# Altium schematic symbol library Analog Devices Operational Amplifiers.SchLib: 2102 symbols (part 19 of 35) (continued)
## AD8628WARZ-R7
designator U?
Single Channel RRIO Operational Amplifier, 2.5 MHz BW, 1 V/us SR, Automotive, 8-pin SOIC (R-8), Reel; Generic Part Number: AD8628; Manufacturer: Analog Devices; PartNumber: AD8628WARZ-R7; Amplifiers Per Package: 1; Automotive Qualified: Yes; Input Bias Current: 30pA; Input Offset Voltage: 1uV; Iq/Amp: 1.1mA; Slew Rate: 1V/us; Small Signal Bandwidth: 2.5MHz; V Span Max: 6V; V Span Min: 2.7V; DatasheetVersion: Rev. I; PackageVersion: 060506-A; PackageReference: R-8; PackageDescription: 8-Pin Standard Small Outline Package, Body 3.9 x 4.9 mm, Pitch 1.27 mm; Supplier 1: Digi-Key; Supplier Part Number 1: AD8628WARZ-R7TR-ND; Supplier 2: Digi-Key; Supplier Part Number 2: AD8628WARZ-R7CT-ND; Supplier 3: Digi-Key; Supplier Part Number 3: AD8628WARZ-R7DKR-ND; Mounting Technology: Surface Mount; Code_JEDEC: MS-012-AA; ComponentLink1Description: Manufacturer URL; ComponentLink1URL: http://www.analog.com/en/index.html; ComponentLink2Description: Datasheet; ComponentLink2URL: http://www.analog.com/static/imported-files/data_sheets/AD8628_8629_8630.pdf; ComponentLink3Description: Package Specification; ComponentLink3URL: http://www.analog.com/static/imported-files/packages/PKG_PDF/SOIC_Narrow%20(R)/R_8.pdf; ComponentLink4Description: Reference Circuit; ComponentLink4URL: http://www.analog.com/en/all-operational-amplifiers-op-amps/operational-amplifiers-op-amps/ad8628/products/product.html#product-recommendations
footprint ADI-R-8_N (SOIC, 8-Leads, Body 4.9x3.9mm, Pitch 1.27mm, IPC Medium Density)
footprint ADI-R-8_L (SOIC, 8-Leads, Body 4.9x3.9mm, Pitch 1.27mm, IPC High Density)
footprint ADI-R-8_M (SOIC, 8-Leads, Body 4.9x3.9mm, Pitch 1.27mm, IPC Low Density)
part A pins: 2 -IN (in), 3 +IN (in), 4 -V (power), 6 OUT (out), 7 +V (power)
part B pins: 1 NC, 5 NC, 8 NC

## AD8628WARZ-RL
designator U?
Single Channel RRIO Operational Amplifier, 2.5 MHz BW, 1 V/us SR, Automotive, 8-pin SOIC (R-8), Reel; Generic Part Number: AD8628; Manufacturer: Analog Devices; PartNumber: AD8628WARZ-RL; Amplifiers Per Package: 1; Automotive Qualified: Yes; Input Bias Current: 30pA; Input Offset Voltage: 1uV; Iq/Amp: 1.1mA; Slew Rate: 1V/us; Small Signal Bandwidth: 2.5MHz; V Span Max: 6V; V Span Min: 2.7V; DatasheetVersion: Rev. I; PackageVersion: 060506-A; PackageReference: R-8; PackageDescription: 8-Pin Standard Small Outline Package, Body 3.9 x 4.9 mm, Pitch 1.27 mm; Supplier 1: Digi-Key; Supplier Part Number 1: AD8628WARZ-RL-ND; Mounting Technology: Surface Mount; Code_JEDEC: MS-012-AA; ComponentLink1Description: Manufacturer URL; ComponentLink1URL: http://www.analog.com/en/index.html; ComponentLink2Description: Datasheet; ComponentLink2URL: http://www.analog.com/static/imported-files/data_sheets/AD8628_8629_8630.pdf; ComponentLink3Description: Package Specification; ComponentLink3URL: http://www.analog.com/static/imported-files/packages/PKG_PDF/SOIC_Narrow%20(R)/R_8.pdf; ComponentLink4Description: Reference Circuit; ComponentLink4URL: http://www.analog.com/en/all-operational-amplifiers-op-amps/operational-amplifiers-op-amps/ad8628/products/product.html#product-recommendations
footprint ADI-R-8_N (SOIC, 8-Leads, Body 4.9x3.9mm, Pitch 1.27mm, IPC Medium Density)
footprint ADI-R-8_L (SOIC, 8-Leads, Body 4.9x3.9mm, Pitch 1.27mm, IPC High Density)
footprint ADI-R-8_M (SOIC, 8-Leads, Body 4.9x3.9mm, Pitch 1.27mm, IPC Low Density)
part A pins: 2 -IN (in), 3 +IN (in), 4 -V (power), 6 OUT (out), 7 +V (power)
part B pins: 1 NC, 5 NC, 8 NC

## AD8628WAUJZ-R7
designator U?
Single Channel RRIO Operational Amplifier, 2.5 MHz BW, 1 V/us SR, Automotive, 5-pin SOT23 (UJ-5), Reel; Generic Part Number: AD8628; Manufacturer: Analog Devices; PartNumber: AD8628WAUJZ-R7; Amplifiers Per Package: 1; Automotive Qualified: Yes; Input Bias Current: 30pA; Input Offset Voltage: 1uV; Iq/Amp: 1.1mA; Slew Rate: 1V/us; Small Signal Bandwidth: 2.5MHz; V Span Max: 6V; V Span Min: 2.7V; DatasheetVersion: Rev. I; PackageVersion: 100708-A; PackageReference: UJ-5; PackageDescription: 5-Pin Thin Small Outline Transistor Package, Body 2.9 x 1.6 mm, Pitch 0.95 mm; Supplier 1: Digi-Key; Supplier Part Number 1: AD8628WAUJZ-R7TR-ND; Supplier 2: Digi-Key; Supplier Part Number 2: AD8628WAUJZ-R7CT-ND; Supplier 3: Digi-Key; Supplier Part Number 3: AD8628WAUJZ-R7DKR-ND; Mounting Technology: Surface Mount; Code_JEDEC: MO-193-AB; ComponentLink1Description: Manufacturer URL; ComponentLink1URL: http://www.analog.com/en/index.html; ComponentLink2Description: Datasheet; ComponentLink2URL: http://www.analog.com/static/imported-files/data_sheets/AD8628_8629_8630.pdf; ComponentLink3Description: Package Specification; ComponentLink3URL: http:/www.analog.com/static/imported-files/packages/PKG_PDF/TSOT(UJ)/UJ_5.pdf; ComponentLink4Description: Reference Circuit; ComponentLink4URL: http://www.analog.com/en/all-operational-amplifiers-op-amps/operational-amplifiers-op-amps/ad8628/products/product.html#product-recommendations
footprint ADI-UJ-5_N (SOT23, 5-Leads, Body 2.9x1.6mm, Pitch 0.95mm, IPC Medium Density)
footprint ADI-UJ-5_L (SOT23, 5-Leads, Body 2.9x1.6mm, Pitch 0.95mm, IPC High Density)
footprint ADI-UJ-5_M (SOT23, 5-Leads, Body 2.9x1.6mm, Pitch 0.95mm, IPC Low Density)
pins: 1 OUT (out), 2 -V (power), 3 +IN (in), 4 -IN (in), 5 +V (power)

## AD8628WAUJZ-RL
designator U?
Single Channel RRIO Operational Amplifier, 2.5 MHz BW, 1 V/us SR, Automotive, 5-pin SOT23 (UJ-5), Reel; Generic Part Number: AD8628; Manufacturer: Analog Devices; PartNumber: AD8628WAUJZ-RL; Amplifiers Per Package: 1; Automotive Qualified: Yes; Input Bias Current: 30pA; Input Offset Voltage: 1uV; Iq/Amp: 1.1mA; Slew Rate: 1V/us; Small Signal Bandwidth: 2.5MHz; V Span Max: 6V; V Span Min: 2.7V; DatasheetVersion: Rev. I; PackageVersion: 100708-A; PackageReference: UJ-5; PackageDescription: 5-Pin Thin Small Outline Transistor Package, Body 2.9 x 1.6 mm, Pitch 0.95 mm; Supplier 1: Digi-Key; Supplier Part Number 1: AD8628WAUJZ-RL-ND; Mounting Technology: Surface Mount; Code_JEDEC: MO-193-AB; ComponentLink1Description: Manufacturer URL; ComponentLink1URL: http://www.analog.com/en/index.html; ComponentLink2Description: Datasheet; ComponentLink2URL: http://www.analog.com/static/imported-files/data_sheets/AD8628_8629_8630.pdf; ComponentLink3Description: Package Specification; ComponentLink3URL: http:/www.analog.com/static/imported-files/packages/PKG_PDF/TSOT(UJ)/UJ_5.pdf; ComponentLink4Description: Reference Circuit; ComponentLink4URL: http://www.analog.com/en/all-operational-amplifiers-op-amps/operational-amplifiers-op-amps/ad8628/products/product.html#product-recommendations
footprint ADI-UJ-5_N (SOT23, 5-Leads, Body 2.9x1.6mm, Pitch 0.95mm, IPC Medium Density)
footprint ADI-UJ-5_L (SOT23, 5-Leads, Body 2.9x1.6mm, Pitch 0.95mm, IPC High Density)
footprint ADI-UJ-5_M (SOT23, 5-Leads, Body 2.9x1.6mm, Pitch 0.95mm, IPC Low Density)
pins: 1 OUT (out), 2 -V (power), 3 +IN (in), 4 -IN (in), 5 +V (power)

## AD8629ARMZ
designator U?
Double Channel RRIO Operational Amplifier, 2.5 MHz BW, 1 V/us SR, Industrial, 8-pin SOP (RM-8), Tube; Generic Part Number: AD8629; Manufacturer: Analog Devices; PartNumber: AD8629ARMZ; Amplifiers Per Package: 2; Automotive Qualified: Yes; Input Bias Current: 30pA; Input Offset Voltage: 1uV; Iq/Amp: 1.1mA; Slew Rate: 1V/us; Small Signal Bandwidth: 2.5MHz; V Span Max: 6V; V Span Min: 2.7V; DatasheetVersion: Rev. I; PackageReference: RM-8; PackageDescription: 8-Pin Mini Small Outline Package, Body 3 x 3 mm, Pitch 0.65 mm; Supplier 1: Digi-Key; Supplier Part Number 1: AD8629ARMZ-ND; Supplier 2: Newark; Supplier Part Number 2: 19P8311; Mounting Technology: Surface Mount; Code_JEDEC: MO-187-AA; ComponentLink1Description: Manufacturer URL; ComponentLink1URL: http://www.analog.com/en/index.html; ComponentLink2Description: Datasheet; ComponentLink2URL: http://www.analog.com/static/imported-files/data_sheets/AD8628_8629_8630.pdf; ComponentLink3Description: Package Specification; ComponentLink3URL: http://www.analog.com/static/imported-files/packages/PKG_PDF/MSOP%28RM%29/RM_8.pdf; ComponentLink4Description: Reference Circuit; ComponentLink4URL: http://www.analog.com/en/all-operational-amplifiers-op-amps/operational-amplifiers-op-amps/ad8629/products/product.html#product-recommendations
footprint ADI-RM-8_N (SOP, 8-Leads, Body 3x3mm, Pitch 0.65mm, IPC Medium Density)
footprint ADI-RM-8_L (SOP, 8-Leads, Body 3x3mm, Pitch 0.65mm, IPC High Density)
footprint ADI-RM-8_M (SOP, 8-Leads, Body 3x3mm, Pitch 0.65mm, IPC Low Density)
pins on every part: 4 -V (power), 8 +V (power)
part A pins: 1 OUT A (out), 2 -IN A (in), 3 +IN A (in)
part B pins: 5 +IN B (in), 6 -IN B (in), 7 OUT B (out)

## AD8629ARMZ-REEL
designator U?
Double Channel RRIO Operational Amplifier, 2.5 MHz BW, 1 V/us SR, Industrial, 8-pin SOP (RM-8), Reel; Generic Part Number: AD8629; Manufacturer: Analog Devices; PartNumber: AD8629ARMZ-REEL; Amplifiers Per Package: 2; Automotive Qualified: Yes; Input Bias Current: 30pA; Input Offset Voltage: 1uV; Iq/Amp: 1.1mA; Slew Rate: 1V/us; Small Signal Bandwidth: 2.5MHz; V Span Max: 6V; V Span Min: 2.7V; DatasheetVersion: Rev. I; PackageReference: RM-8; PackageDescription: 8-Pin Mini Small Outline Package, Body 3 x 3 mm, Pitch 0.65 mm; Supplier 1: Digi-Key; Supplier Part Number 1: AD8629ARMZ-REELTR-ND; Supplier 2: Digi-Key; Supplier Part Number 2: AD8629ARMZ-REELCT-ND; Supplier 3: Digi-Key; Supplier Part Number 3: AD8629ARMZ-REELDKR-ND; Supplier 4: Newark; Supplier Part Number 4: 59K7003; Mounting Technology: Surface Mount; Code_JEDEC: MO-187-AA; ComponentLink1Description: Manufacturer URL; ComponentLink1URL: http://www.analog.com/en/index.html; ComponentLink2Description: Datasheet; ComponentLink2URL: http://www.analog.com/static/imported-files/data_sheets/AD8628_8629_8630.pdf; ComponentLink3Description: Package Specification; ComponentLink3URL: http://www.analog.com/static/imported-files/packages/PKG_PDF/MSOP%28RM%29/RM_8.pdf; ComponentLink4Description: Reference Circuit; ComponentLink4URL: http://www.analog.com/en/all-operational-amplifiers-op-amps/operational-amplifiers-op-amps/ad8629/products/product.html#product-recommendations
footprint ADI-RM-8_N (SOP, 8-Leads, Body 3x3mm, Pitch 0.65mm, IPC Medium Density)
footprint ADI-RM-8_L (SOP, 8-Leads, Body 3x3mm, Pitch 0.65mm, IPC High Density)
footprint ADI-RM-8_M (SOP, 8-Leads, Body 3x3mm, Pitch 0.65mm, IPC Low Density)
pins on every part: 4 -V (power), 8 +V (power)
part A pins: 1 OUT A (out), 2 -IN A (in), 3 +IN A (in)
part B pins: 5 +IN B (in), 6 -IN B (in), 7 OUT B (out)

## AD8629ARZ
designator U?
Double Channel RRIO Operational Amplifier, 2.5 MHz BW, 1 V/us SR, Industrial, 8-pin SOIC (R-8), Tube; Generic Part Number: AD8629; Manufacturer: Analog Devices; PartNumber: AD8629ARZ; Amplifiers Per Package: 2; Automotive Qualified: Yes; Input Bias Current: 30pA; Input Offset Voltage: 1uV; Iq/Amp: 1.1mA; Slew Rate: 1V/us; Small Signal Bandwidth: 2.5MHz; V Span Max: 6V; V Span Min: 2.7V; DatasheetVersion: Rev. I; PackageVersion: 060506-A; PackageReference: R-8; PackageDescription: 8-Pin Standard Small Outline Package, Body 3.9 x 4.9 mm, Pitch 1.27 mm; Supplier 1: Digi-Key; Supplier Part Number 1: AD8629ARZ-ND; Supplier 2: Farnell; Supplier Part Number 2: 9994300; Supplier 3: Newark; Supplier Part Number 3: 19M0981; Mounting Technology: Surface Mount; Code_JEDEC: MS-012-AA; ComponentLink1Description: Manufacturer URL; ComponentLink1URL: http://www.analog.com/en/index.html; ComponentLink2Description: Datasheet; ComponentLink2URL: http://www.analog.com/static/imported-files/data_sheets/AD8628_8629_8630.pdf; ComponentLink3Description: Package Specification; ComponentLink3URL: http://www.analog.com/static/imported-files/packages/PKG_PDF/SOIC_Narrow%20(R)/R_8.pdf; ComponentLink4Description: Reference Circuit; ComponentLink4URL: http://www.analog.com/en/all-operational-amplifiers-op-amps/operational-amplifiers-op-amps/ad8629/products/product.html#product-recommendations
footprint ADI-R-8_N (SOIC, 8-Leads, Body 4.9x3.9mm, Pitch 1.27mm, IPC Medium Density)
footprint ADI-R-8_L (SOIC, 8-Leads, Body 4.9x3.9mm, Pitch 1.27mm, IPC High Density)
footprint ADI-R-8_M (SOIC, 8-Leads, Body 4.9x3.9mm, Pitch 1.27mm, IPC Low Density)
pins on every part: 4 -V (power), 8 +V (power)
part A pins: 1 OUT A (out), 2 -IN A (in), 3 +IN A (in)
part B pins: 5 +IN B (in), 6 -IN B (in), 7 OUT B (out)

## AD8629ARZ-REEL
designator U?
Double Channel RRIO Operational Amplifier, 2.5 MHz BW, 1 V/us SR, Industrial, 8-pin SOIC (R-8), Reel; Generic Part Number: AD8629; Manufacturer: Analog Devices; PartNumber: AD8629ARZ-REEL; Amplifiers Per Package: 2; Automotive Qualified: Yes; Input Bias Current: 30pA; Input Offset Voltage: 1uV; Iq/Amp: 1.1mA; Slew Rate: 1V/us; Small Signal Bandwidth: 2.5MHz; V Span Max: 6V; V Span Min: 2.7V; DatasheetVersion: Rev. I; PackageVersion: 060506-A; PackageReference: R-8; PackageDescription: 8-Pin Standard Small Outline Package, Body 3.9 x 4.9 mm, Pitch 1.27 mm; Supplier 1: Digi-Key; Supplier Part Number 1: AD8629ARZ-REEL-ND; Supplier 2: Newark; Supplier Part Number 2: 59K7006; Mounting Technology: Surface Mount; Code_JEDEC: MS-012-AA; ComponentLink1Description: Manufacturer URL; ComponentLink1URL: http://www.analog.com/en/index.html; ComponentLink2Description: Datasheet; ComponentLink2URL: http://www.analog.com/static/imported-files/data_sheets/AD8628_8629_8630.pdf; ComponentLink3Description: Package Specification; ComponentLink3URL: http://www.analog.com/static/imported-files/packages/PKG_PDF/SOIC_Narrow%20(R)/R_8.pdf; ComponentLink4Description: Reference Circuit; ComponentLink4URL: http://www.analog.com/en/all-operational-amplifiers-op-amps/operational-amplifiers-op-amps/ad8629/products/product.html#product-recommendations
footprint ADI-R-8_N (SOIC, 8-Leads, Body 4.9x3.9mm, Pitch 1.27mm, IPC Medium Density)
footprint ADI-R-8_L (SOIC, 8-Leads, Body 4.9x3.9mm, Pitch 1.27mm, IPC High Density)
footprint ADI-R-8_M (SOIC, 8-Leads, Body 4.9x3.9mm, Pitch 1.27mm, IPC Low Density)
pins on every part: 4 -V (power), 8 +V (power)
part A pins: 1 OUT A (out), 2 -IN A (in), 3 +IN A (in)
part B pins: 5 +IN B (in), 6 -IN B (in), 7 OUT B (out)

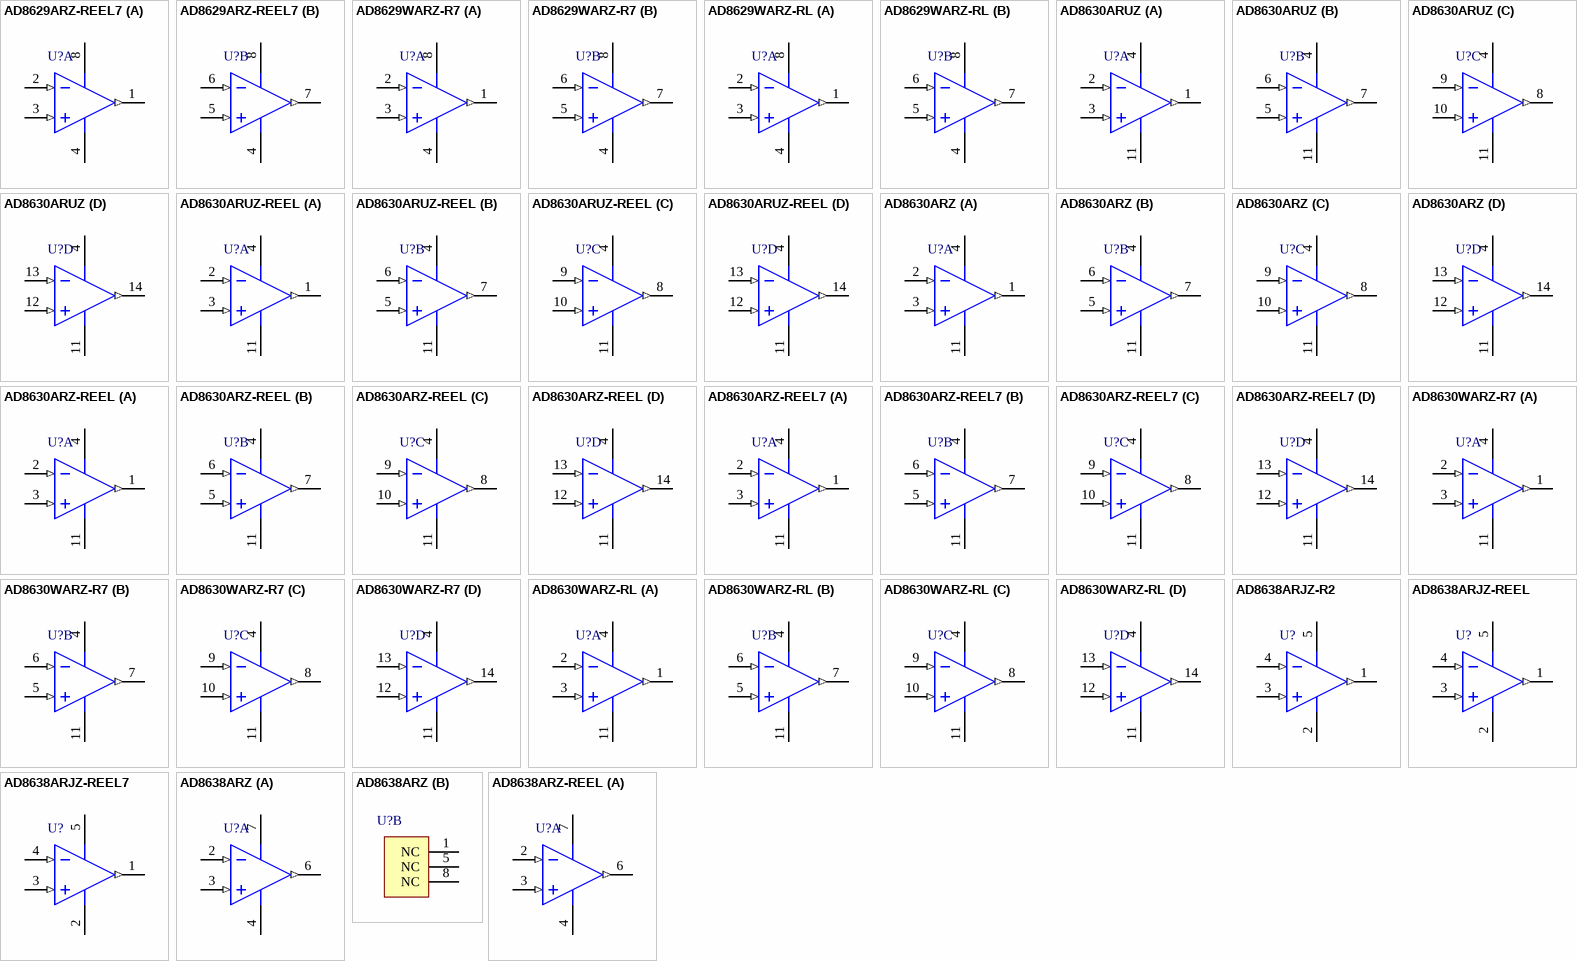
[diagram p57: symbols AD8629ARZ-REEL7 to AD8638ARZ-REEL]

## AD8629ARZ-REEL7
designator U?
Double Channel RRIO Operational Amplifier, 2.5 MHz BW, 1 V/us SR, Industrial, 8-pin SOIC (R-8), Reel; Generic Part Number: AD8629; Manufacturer: Analog Devices; PartNumber: AD8629ARZ-REEL7; Amplifiers Per Package: 2; Automotive Qualified: Yes; Input Bias Current: 30pA; Input Offset Voltage: 1uV; Iq/Amp: 1.1mA; Slew Rate: 1V/us; Small Signal Bandwidth: 2.5MHz; V Span Max: 6V; V Span Min: 2.7V; DatasheetVersion: Rev. I; PackageVersion: 060506-A; PackageReference: R-8; PackageDescription: 8-Pin Standard Small Outline Package, Body 3.9 x 4.9 mm, Pitch 1.27 mm; Supplier 1: Digi-Key; Supplier Part Number 1: AD8629ARZ-REEL7TR-ND; Supplier 2: Digi-Key; Supplier Part Number 2: AD8629ARZ-REEL7CT-ND; Supplier 3: Digi-Key; Supplier Part Number 3: AD8629ARZ-REEL7DKR-ND; Supplier 4: Newark; Supplier Part Number 4: 59K7007; Mounting Technology: Surface Mount; Code_JEDEC: MS-012-AA; ComponentLink1Description: Manufacturer URL; ComponentLink1URL: http://www.analog.com/en/index.html; ComponentLink2Description: Datasheet; ComponentLink2URL: http://www.analog.com/static/imported-files/data_sheets/AD8628_8629_8630.pdf; ComponentLink3Description: Package Specification; ComponentLink3URL: http://www.analog.com/static/imported-files/packages/PKG_PDF/SOIC_Narrow%20(R)/R_8.pdf; ComponentLink4Description: Reference Circuit; ComponentLink4URL: http://www.analog.com/en/all-operational-amplifiers-op-amps/operational-amplifiers-op-amps/ad8629/products/product.html#product-recommendations
footprint ADI-R-8_N (SOIC, 8-Leads, Body 4.9x3.9mm, Pitch 1.27mm, IPC Medium Density)
footprint ADI-R-8_L (SOIC, 8-Leads, Body 4.9x3.9mm, Pitch 1.27mm, IPC High Density)
footprint ADI-R-8_M (SOIC, 8-Leads, Body 4.9x3.9mm, Pitch 1.27mm, IPC Low Density)
pins on every part: 4 -V (power), 8 +V (power)
part A pins: 1 OUT A (out), 2 -IN A (in), 3 +IN A (in)
part B pins: 5 +IN B (in), 6 -IN B (in), 7 OUT B (out)

## AD8629WARZ-R7
designator U?
Double Channel RRIO Operational Amplifier, 2.5 MHz BW, 1 V/us SR, Automotive, 8-pin SOIC (R-8), Reel; Generic Part Number: AD8629; Manufacturer: Analog Devices; PartNumber: AD8629WARZ-R7; Amplifiers Per Package: 2; Automotive Qualified: Yes; Input Bias Current: 30pA; Input Offset Voltage: 1uV; Iq/Amp: 1.1mA; Slew Rate: 1V/us; Small Signal Bandwidth: 2.5MHz; V Span Max: 6V; V Span Min: 2.7V; DatasheetVersion: Rev. I; PackageVersion: 060506-A; PackageReference: R-8; PackageDescription: 8-Pin Standard Small Outline Package, Body 3.9 x 4.9 mm, Pitch 1.27 mm; Supplier 1: Digi-Key; Supplier Part Number 1: AD8629WARZ-R7TR-ND; Supplier 2: Digi-Key; Supplier Part Number 2: AD8629WARZ-R7CT-ND; Supplier 3: Digi-Key; Supplier Part Number 3: AD8629WARZ-R7DKR-ND; Mounting Technology: Surface Mount; Code_JEDEC: MS-012-AA; ComponentLink1Description: Manufacturer URL; ComponentLink1URL: http://www.analog.com/en/index.html; ComponentLink2Description: Datasheet; ComponentLink2URL: http://www.analog.com/static/imported-files/data_sheets/AD8628_8629_8630.pdf; ComponentLink3Description: Package Specification; ComponentLink3URL: http://www.analog.com/static/imported-files/packages/PKG_PDF/SOIC_Narrow%20(R)/R_8.pdf; ComponentLink4Description: Reference Circuit; ComponentLink4URL: http://www.analog.com/en/all-operational-amplifiers-op-amps/operational-amplifiers-op-amps/ad8629/products/product.html#product-recommendations
footprint ADI-R-8_N (SOIC, 8-Leads, Body 4.9x3.9mm, Pitch 1.27mm, IPC Medium Density)
footprint ADI-R-8_L (SOIC, 8-Leads, Body 4.9x3.9mm, Pitch 1.27mm, IPC High Density)
footprint ADI-R-8_M (SOIC, 8-Leads, Body 4.9x3.9mm, Pitch 1.27mm, IPC Low Density)
pins on every part: 4 -V (power), 8 +V (power)
part A pins: 1 OUT A (out), 2 -IN A (in), 3 +IN A (in)
part B pins: 5 +IN B (in), 6 -IN B (in), 7 OUT B (out)

## AD8629WARZ-RL
designator U?
Double Channel RRIO Operational Amplifier, 2.5 MHz BW, 1 V/us SR, Automotive, 8-pin SOIC (R-8), Reel; Generic Part Number: AD8629; Manufacturer: Analog Devices; PartNumber: AD8629WARZ-RL; Amplifiers Per Package: 2; Automotive Qualified: Yes; Input Bias Current: 30pA; Input Offset Voltage: 1uV; Iq/Amp: 1.1mA; Slew Rate: 1V/us; Small Signal Bandwidth: 2.5MHz; V Span Max: 6V; V Span Min: 2.7V; DatasheetVersion: Rev. I; PackageVersion: 060506-A; PackageReference: R-8; PackageDescription: 8-Pin Standard Small Outline Package, Body 3.9 x 4.9 mm, Pitch 1.27 mm; Supplier 1: Digi-Key; Supplier Part Number 1: AD8629WARZ-RL-ND; Mounting Technology: Surface Mount; Code_JEDEC: MS-012-AA; ComponentLink1Description: Manufacturer URL; ComponentLink1URL: http://www.analog.com/en/index.html; ComponentLink2Description: Datasheet; ComponentLink2URL: http://www.analog.com/static/imported-files/data_sheets/AD8628_8629_8630.pdf; ComponentLink3Description: Package Specification; ComponentLink3URL: http://www.analog.com/static/imported-files/packages/PKG_PDF/SOIC_Narrow%20(R)/R_8.pdf; ComponentLink4Description: Reference Circuit; ComponentLink4URL: http://www.analog.com/en/all-operational-amplifiers-op-amps/operational-amplifiers-op-amps/ad8629/products/product.html#product-recommendations
footprint ADI-R-8_N (SOIC, 8-Leads, Body 4.9x3.9mm, Pitch 1.27mm, IPC Medium Density)
footprint ADI-R-8_L (SOIC, 8-Leads, Body 4.9x3.9mm, Pitch 1.27mm, IPC High Density)
footprint ADI-R-8_M (SOIC, 8-Leads, Body 4.9x3.9mm, Pitch 1.27mm, IPC Low Density)
pins on every part: 4 -V (power), 8 +V (power)
part A pins: 1 OUT A (out), 2 -IN A (in), 3 +IN A (in)
part B pins: 5 +IN B (in), 6 -IN B (in), 7 OUT B (out)

## AD8630ARUZ
designator U?
Quad Channel RRIO Operational Amplifier, 2.5 MHz BW, 1 V/us SR, Industrial, 14-pin SOP (RU-14), Tube; Generic Part Number: AD8630; Manufacturer: Analog Devices; PartNumber: AD8630ARUZ; Amplifiers Per Package: 4; Automotive Qualified: Yes; Input Bias Current: 100pA; Input Offset Voltage: 1uV; Iq/Amp: 1.1mA; Slew Rate: 1V/us; Small Signal Bandwidth: 2.5MHz; V Span Max: 6V; V Span Min: 2.7V; DatasheetVersion: Rev. I; PackageReference: RU-14; PackageDescription: 14-Pin Thin Shrink Small Outline Package, Body 5 x 4.4 mm, Pitch 0.65 mm; Supplier 1: Digi-Key; Supplier Part Number 1: AD8630ARUZ-ND; Supplier 2: Farnell; Supplier Part Number 2: 1078274; Supplier 3: Newark; Supplier Part Number 3: 19M0982; Mounting Technology: Surface Mount; Code_JEDEC: MO-153AB-1; ComponentLink1Description: Manufacturer URL; ComponentLink1URL: http://www.analog.com/en/index.html; ComponentLink2Description: Datasheet; ComponentLink2URL: http://www.analog.com/static/imported-files/data_sheets/AD8628_8629_8630.pdf; ComponentLink3Description: Package Specification; ComponentLink3URL: http://www.analog.com/static/imported-files/packages/36057385283879153717235186773RU14.pdf
footprint ADI-RU-14_N (SOP, 14-Leads, Body 5x4.4mm, Pitch 0.65mm, IPC Medium Density)
footprint ADI-RU-14_L (SOP, 14-Leads, Body 5x4.4mm, Pitch 0.65mm, IPC High Density)
footprint ADI-RU-14_M (SOP, 14-Leads, Body 5x4.4mm, Pitch 0.65mm, IPC Low Density)
pins on every part: 4 +V (power), 11 -V (power)
part A pins: 1 OUT A (out), 2 -IN A (in), 3 +IN A (in)
part B pins: 5 +IN B (in), 6 -IN B (in), 7 OUT B (out)
part C pins: 8 OUT C (out), 9 -IN C (in), 10 +IN C (in)
part D pins: 12 +IN D (in), 13 -IN D (in), 14 OUT D (out)

## AD8630ARUZ-REEL
designator U?
Quad Channel RRIO Operational Amplifier, 2.5 MHz BW, 1 V/us SR, Industrial, 14-pin SOP (RU-14), Reel; Generic Part Number: AD8630; Manufacturer: Analog Devices; PartNumber: AD8630ARUZ-REEL; Amplifiers Per Package: 4; Automotive Qualified: Yes; Input Bias Current: 100pA; Input Offset Voltage: 1uV; Iq/Amp: 1.1mA; Slew Rate: 1V/us; Small Signal Bandwidth: 2.5MHz; V Span Max: 6V; V Span Min: 2.7V; DatasheetVersion: Rev. I; PackageReference: RU-14; PackageDescription: 14-Pin Thin Shrink Small Outline Package, Body 5 x 4.4 mm, Pitch 0.65 mm; Supplier 1: Digi-Key; Supplier Part Number 1: AD8630ARUZ-REELTR-ND; Supplier 2: Digi-Key; Supplier Part Number 2: AD8630ARUZ-REELCT-ND; Supplier 3: Digi-Key; Supplier Part Number 3: AD8630ARUZ-REELDKR-ND; Supplier 4: Newark; Supplier Part Number 4: 59K7009; Mounting Technology: Surface Mount; Code_JEDEC: MO-153AB-1; ComponentLink1Description: Manufacturer URL; ComponentLink1URL: http://www.analog.com/en/index.html; ComponentLink2Description: Datasheet; ComponentLink2URL: http://www.analog.com/static/imported-files/data_sheets/AD8628_8629_8630.pdf; ComponentLink3Description: Package Specification; ComponentLink3URL: http://www.analog.com/static/imported-files/packages/36057385283879153717235186773RU14.pdf
footprint ADI-RU-14_N (SOP, 14-Leads, Body 5x4.4mm, Pitch 0.65mm, IPC Medium Density)
footprint ADI-RU-14_L (SOP, 14-Leads, Body 5x4.4mm, Pitch 0.65mm, IPC High Density)
footprint ADI-RU-14_M (SOP, 14-Leads, Body 5x4.4mm, Pitch 0.65mm, IPC Low Density)
pins on every part: 4 +V (power), 11 -V (power)
part A pins: 1 OUT A (out), 2 -IN A (in), 3 +IN A (in)
part B pins: 5 +IN B (in), 6 -IN B (in), 7 OUT B (out)
part C pins: 8 OUT C (out), 9 -IN C (in), 10 +IN C (in)
part D pins: 12 +IN D (in), 13 -IN D (in), 14 OUT D (out)

## AD8630ARZ
designator U?
Quad Channel RRIO Operational Amplifier, 2.5 MHz BW, 1 V/us SR, Industrial, 14-pin SOIC (R-14), Tube; Generic Part Number: AD8630; Manufacturer: Analog Devices; PartNumber: AD8630ARZ; Amplifiers Per Package: 4; Automotive Qualified: Yes; Input Bias Current: 100pA; Input Offset Voltage: 1uV; Iq/Amp: 1.1mA; Slew Rate: 1V/us; Small Signal Bandwidth: 2.5MHz; V Span Max: 6V; V Span Min: 2.7V; DatasheetVersion: Rev. I; PackageVersion: 060606-A; PackageReference: R-14; PackageDescription: 14-Pin Standard Small Outline Package, Body 8.65 x 3.9 mm, Pitch 1.27 mm; Supplier 1: Digi-Key; Supplier Part Number 1: AD8630ARZ-ND; Supplier 2: Farnell; Supplier Part Number 2: 1078275; Supplier 3: Newark; Supplier Part Number 3: 19M0983; Mounting Technology: Surface Mount; Code_JEDEC: MS-012-AB; ComponentLink1Description: Manufacturer URL; ComponentLink1URL: http://www.analog.com/en/index.html; ComponentLink2Description: Datasheet; ComponentLink2URL: http://www.analog.com/static/imported-files/data_sheets/AD8628_8629_8630.pdf; ComponentLink3Description: Package Specification; ComponentLink3URL: http://www.analog.com/static/imported-files/packages/PKG_PDF/SOIC_Narrow%20(R)/R_14.pdf
footprint ADI-R-14_N (SOIC, 14-Leads, Body 8.65x3.9mm, Pitch 1.27mm, IPC Medium Density)
footprint ADI-R-14_L (SOIC, 14-Leads, Body 8.65x3.9mm, Pitch 1.27mm, IPC High Density)
footprint ADI-R-14_M (SOIC, 14-Leads, Body 8.65x3.9mm, Pitch 1.27mm, IPC Low Density)
pins on every part: 4 +V (power), 11 -V (power)
part A pins: 1 OUT A (out), 2 -IN A (in), 3 +IN A (in)
part B pins: 5 +IN B (in), 6 -IN B (in), 7 OUT B (out)
part C pins: 8 OUT C (out), 9 -IN C (in), 10 +IN C (in)
part D pins: 12 +IN D (in), 13 -IN D (in), 14 OUT D (out)

## AD8630ARZ-REEL
designator U?
Quad Channel RRIO Operational Amplifier, 2.5 MHz BW, 1 V/us SR, Industrial, 14-pin SOIC (R-14), Reel; Generic Part Number: AD8630; Manufacturer: Analog Devices; PartNumber: AD8630ARZ-REEL; Amplifiers Per Package: 4; Automotive Qualified: Yes; Input Bias Current: 100pA; Input Offset Voltage: 1uV; Iq/Amp: 1.1mA; Slew Rate: 1V/us; Small Signal Bandwidth: 2.5MHz; V Span Max: 6V; V Span Min: 2.7V; DatasheetVersion: Rev. I; PackageVersion: 060606-A; PackageReference: R-14; PackageDescription: 14-Pin Standard Small Outline Package, Body 8.65 x 3.9 mm, Pitch 1.27 mm; Supplier 1: Digi-Key; Supplier Part Number 1: AD8630ARZ-REEL-ND; Mounting Technology: Surface Mount; Code_JEDEC: MS-012-AB; ComponentLink1Description: Manufacturer URL; ComponentLink1URL: http://www.analog.com/en/index.html; ComponentLink2Description: Datasheet; ComponentLink2URL: http://www.analog.com/static/imported-files/data_sheets/AD8628_8629_8630.pdf; ComponentLink3Description: Package Specification; ComponentLink3URL: http://www.analog.com/static/imported-files/packages/PKG_PDF/SOIC_Narrow%20(R)/R_14.pdf
footprint ADI-R-14_N (SOIC, 14-Leads, Body 8.65x3.9mm, Pitch 1.27mm, IPC Medium Density)
footprint ADI-R-14_L (SOIC, 14-Leads, Body 8.65x3.9mm, Pitch 1.27mm, IPC High Density)
footprint ADI-R-14_M (SOIC, 14-Leads, Body 8.65x3.9mm, Pitch 1.27mm, IPC Low Density)
pins on every part: 4 +V (power), 11 -V (power)
part A pins: 1 OUT A (out), 2 -IN A (in), 3 +IN A (in)
part B pins: 5 +IN B (in), 6 -IN B (in), 7 OUT B (out)
part C pins: 8 OUT C (out), 9 -IN C (in), 10 +IN C (in)
part D pins: 12 +IN D (in), 13 -IN D (in), 14 OUT D (out)

## AD8630ARZ-REEL7
designator U?
Quad Channel RRIO Operational Amplifier, 2.5 MHz BW, 1 V/us SR, Industrial, 14-pin SOIC (R-14), Reel; Generic Part Number: AD8630; Manufacturer: Analog Devices; PartNumber: AD8630ARZ-REEL7; Amplifiers Per Package: 4; Automotive Qualified: Yes; Input Bias Current: 100pA; Input Offset Voltage: 1uV; Iq/Amp: 1.1mA; Slew Rate: 1V/us; Small Signal Bandwidth: 2.5MHz; V Span Max: 6V; V Span Min: 2.7V; DatasheetVersion: Rev. I; PackageVersion: 060606-A; PackageReference: R-14; PackageDescription: 14-Pin Standard Small Outline Package, Body 8.65 x 3.9 mm, Pitch 1.27 mm; Supplier 1: Digi-Key; Supplier Part Number 1: AD8630ARZ-REEL7TR-ND; Supplier 2: Digi-Key; Supplier Part Number 2: AD8630ARZ-REEL7CT-ND; Supplier 3: Digi-Key; Supplier Part Number 3: AD8630ARZ-REEL7DKR-ND; Supplier 4: Newark; Supplier Part Number 4: 59K7012; Mounting Technology: Surface Mount; Code_JEDEC: MS-012-AB; ComponentLink1Description: Manufacturer URL; ComponentLink1URL: http://www.analog.com/en/index.html; ComponentLink2Description: Datasheet; ComponentLink2URL: http://www.analog.com/static/imported-files/data_sheets/AD8628_8629_8630.pdf; ComponentLink3Description: Package Specification; ComponentLink3URL: http://www.analog.com/static/imported-files/packages/PKG_PDF/SOIC_Narrow%20(R)/R_14.pdf
footprint ADI-R-14_N (SOIC, 14-Leads, Body 8.65x3.9mm, Pitch 1.27mm, IPC Medium Density)
footprint ADI-R-14_L (SOIC, 14-Leads, Body 8.65x3.9mm, Pitch 1.27mm, IPC High Density)
footprint ADI-R-14_M (SOIC, 14-Leads, Body 8.65x3.9mm, Pitch 1.27mm, IPC Low Density)
pins on every part: 4 +V (power), 11 -V (power)
part A pins: 1 OUT A (out), 2 -IN A (in), 3 +IN A (in)
part B pins: 5 +IN B (in), 6 -IN B (in), 7 OUT B (out)
part C pins: 8 OUT C (out), 9 -IN C (in), 10 +IN C (in)
part D pins: 12 +IN D (in), 13 -IN D (in), 14 OUT D (out)
